# Altium footprint library myPCBLib.PcbLib: 113 footprints (part 3 of 8)
Each footprint in its own frame and in the unit in brackets; x right, y up, seen from the top. Pads: shape width x height; smd on the part's side, far side on the other; paste and mask are expansions set on the pad; w line width, h text height; cw(c..) or ccw(c..) is an arc to the next point about the centre after c.
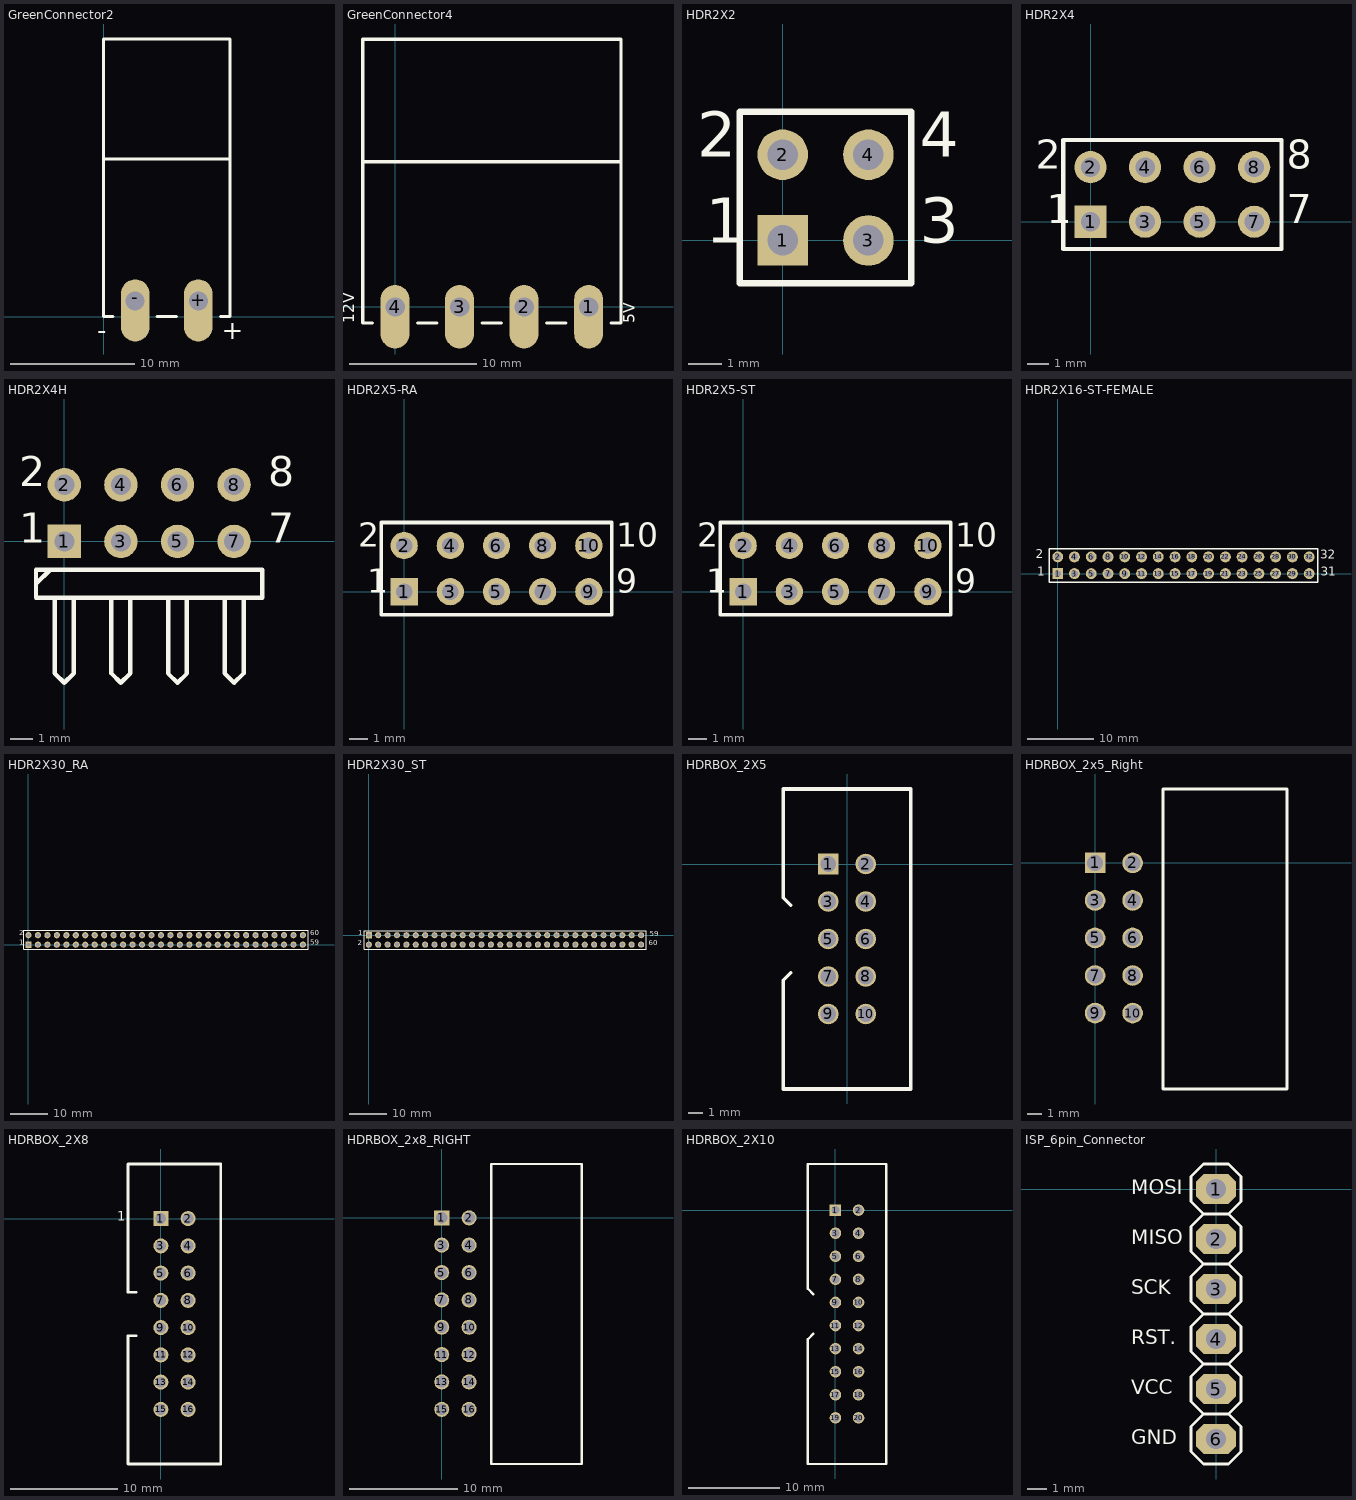
[diagram p2: the footprints below, top view; thin cyan lines are the x and y axes]

## GreenConnector2 [mil] "2 pin green connector"
height 314.96
pads (2):
  oval 90x196.85 hole 60 copper offset 0,-30: +(300,50) -(100,50)
Top Overlay:
  lines w10: 30,0 0,0 0,500 ; 170,0 230,0 ; 370,0 400,0 400,500 ; 0,500 0,880 400,880 400,500 ; 0,500 400,500
  text "-" at -19.68,-70.87 h60
  text "+" at 374.02,-70.87 h60

## GreenConnector4 [mil]
pads (4):
  oval 90x196.85 hole 60 copper offset 0,-30: 1(600,0) 2(400,0) 3(200,0) 4(0,0)
Top Overlay:
  lines w10: -70,-50 -100,-50 -100,450 ; 70,-50 130,-50 ; 270,-50 330,-50 ; 470,-50 530,-50 ; 670,-50 700,-50 700,450 ; -100,450 -100,830 700,830 700,450 ; -100,450 700,450
  text "5V" at 755,-50 h60
  text "12V" at -115,-50 h60

## HDR2X2 [mm]
pads (4):
  rect 1.5x1.5 hole 0.9: 1(0,0)
  round 1.5 hole 0.9: 2(0,2.54) 3(2.54,0) 4(2.54,2.54)
Top Overlay:
  lines w0.2: -1.27,-1.27 -1.27,3.81 3.81,3.81 3.81,-1.27 -1.27,-1.27
  text "1" at -2.286,-0.508 h2.29
  text "2" at -2.54,2.032 h2.29
  text "4" at 4.064,2.032 h2.29
  text "3" at 4.064,-0.508 h2.29

## HDR2X4 [mm]
pads (8):
  rect 1.5x1.5 hole 0.9: 1(0,0)
  round 1.5 hole 0.9: 2(0,2.54) 3(2.54,0) 4(2.54,2.54) 5(5.08,0) 6(5.08,2.54) 7(7.62,0) 8(7.62,2.54)
Top Overlay:
  lines w0.2: -1.27,-1.27 -1.27,3.81 8.89,3.81 8.89,-1.27 -1.27,-1.27
  text "8" at 9.144,2.032 h2.29
  text "7" at 9.144,-0.508 h2.29
  text "1" at -2.032,-0.508 h2.29
  text "2" at -2.54,2.032 h2.29
3D body: height 8.5, standoff -3, extent -1.27,-1.397 8.89,3.683

## HDR2X4H [mm]
pads (8):
  rect 1.5x1.5 hole 0.9: 1(0,0)
  round 1.5 hole 0.9: 2(0,2.54) 3(2.54,0) 4(2.54,2.54) 5(5.08,0) 6(5.08,2.54) 7(7.62,0) 8(7.62,2.54)
Top Overlay:
  lines w0.2: -1.27,-1.905 -0.635,-1.27 ; -0.423,-2.54 -0.423,-5.927 0,-6.35 0.423,-5.927 0.423,-2.54 ; 2.117,-2.54 2.117,-5.927 2.54,-6.35 2.963,-5.927 2.963,-2.54 ; 4.657,-2.54 4.657,-5.927 5.08,-6.35 5.503,-5.927 5.503,-2.54 ; 7.197,-2.54 7.197,-5.927 7.62,-6.35 8.043,-5.927 8.043,-2.54 ; -1.27,-2.54 -1.27,-1.27 8.89,-1.27 8.89,-2.54 -1.27,-2.54
  text "8" at 9.144,2.032 h2.29
  text "7" at 9.144,-0.508 h2.29
  text "1" at -2.032,-0.508 h2.29
  text "2" at -2.032,2.032 h2.29
3D body: height 5.04, standoff -2.96, extent -1.27,-9.996 8.89,2.884

## HDR2X5-RA [mm]
pads (10):
  rect 1.5x1.5 hole 0.9: 1(0,0)
  round 1.5 hole 0.9: 2(0,2.54) 3(2.54,0) 4(2.54,2.54) 5(5.08,0) 6(5.08,2.54) 7(7.62,0) 8(7.62,2.54) 9(10.16,0) 10(10.16,2.54)
Top Overlay:
  lines w0.2: -1.27,-1.27 11.43,-1.27 11.43,3.81 -1.27,3.81 -1.27,-1.27
  text "10" at 11.684,2.032 h2.29
  text "9" at 11.684,-0.508 h2.29
  text "1" at -2.032,-0.508 h2.29
  text "2" at -2.54,2.032 h2.29
3D body: height 5.04, standoff -2.96, extent -1.25,-10.055 11.45,2.825

## HDR2X5-ST [mm]
pads (10):
  rect 1.5x1.5 hole 0.9: 1(0,0)
  round 1.5 hole 0.9: 2(0,2.54) 3(2.54,0) 4(2.54,2.54) 5(5.08,0) 6(5.08,2.54) 7(7.62,0) 8(7.62,2.54) 9(10.16,0) 10(10.16,2.54)
Top Overlay:
  lines w0.2: -1.27,-1.27 -1.27,3.81 11.43,3.81 11.43,-1.27 -1.27,-1.27
  text "2" at -2.54,2.032 h2.29
  text "1" at -2.032,-0.508 h2.29
  text "9" at 11.684,-0.508 h2.29
  text "10" at 11.684,2.032 h2.29
3D body: height 8.5, standoff -3, extent -1.275,-1.175 11.425,3.905

## HDR2X16-ST-FEMALE [mil]
pads (32):
  rect 65x65 hole 40: 1(0,0)
  round 65 hole 40: 2(0,100) 3(100,0) 4(100,100) 5(200,0) 6(200,100) 7(300,0) 8(300,100) 9(400,0) 10(400,100) 11(500,0) 12(500,100) 13(600,0) 14(600,100) 15(700,0) 16(700,100) 17(800,0) 18(800,100) 19(900,0) 20(900,100) 21(1000,0) 22(1000,100) 23(1100,0) 24(1100,100) 25(1200,0) 26(1200,100) 27(1300,0) 28(1300,100) 29(1400,0) 30(1400,100) 31(1500,0) 32(1500,100)
Top Overlay:
  lines w7.87: -50,-50 -50,150 1550,150 1550,-50 -50,-50
  text "32" at 1566.26,70 h90
  text "31" at 1570,-30 h90
  text "1" at -121.42,-29.53 h90
  text "2" at -129.53,75.16 h90
3D body: height 334.65, standoff -125.98, extent -55,-50 1554.84,146.85

## HDR2X30_RA [mil]
pads (60):
  rect 65x65 hole 40: 1(0,0)
  round 65 hole 40: 2(0,100) 3(100,0) 4(100,100) 5(200,0) 6(200,100) 7(300,0) 8(300,100) 9(400,0) 10(400,100) 11(500,0) 12(500,100) 13(600,0) 14(600,100) 15(700,0) 16(700,100) 17(800,0) 18(800,100) 19(900,0) 20(900,100) 21(1000,0) 22(1000,100) 23(1100,0) 24(1100,100) 25(1200,0) 26(1200,100) 27(1300,0) 28(1300,100) 29(1400,0) 30(1400,100) 31(1500,0) 32(1500,100) 33(1600,0) 34(1600,100) 35(1700,0) 36(1700,100) 37(1800,0) 38(1800,100) 39(1900,0) 40(1900,100) 41(2000,0) 42(2000,100) 43(2100,0) 44(2100,100) 45(2200,0) 46(2200,100) 47(2300,0) 48(2300,100) 49(2400,0) 50(2400,100) 51(2500,0) 52(2500,100) 53(2600,0) 54(2600,100) 55(2700,0) 56(2700,100) 57(2800,0) 58(2800,100) 59(2900,0) 60(2900,100)
Top Overlay:
  lines w7.87: -50,-50 2955.12,-50 2955.12,150 -50,150 -50,-50
  text "60" at 2980,80 h90
  text "59" at 2980,-20 h90
  text "1" at -100,-20 h90
  text "2" at -100,80 h90
3D body: height 198.43, standoff -116.54, extent -48.23,-394.88 2951.77,112.21

## HDR2X30_ST [mil]
pads (60):
  rect 65x65 hole 40: 1(0,0)
  round 65 hole 40: 2(0,-100) 3(100,0) 4(100,-100) 5(200,0) 6(200,-100) 7(300,0) 8(300,-100) 9(400,0) 10(400,-100) 11(500,0) 12(500,-100) 13(600,0) 14(600,-100) 15(700,0) 16(700,-100) 17(800,0) 18(800,-100) 19(900,0) 20(900,-100) 21(1000,0) 22(1000,-100) 23(1100,0) 24(1100,-100) 25(1200,0) 26(1200,-100) 27(1300,0) 28(1300,-100) 29(1400,0) 30(1400,-100) 31(1500,0) 32(1500,-100) 33(1600,0) 34(1600,-100) 35(1700,0) 36(1700,-100) 37(1800,0) 38(1800,-100) 39(1900,0) 40(1900,-100) 41(2000,0) 42(2000,-100) 43(2100,0) 44(2100,-100) 45(2200,0) 46(2200,-100) 47(2300,0) 48(2300,-100) 49(2400,0) 50(2400,-100) 51(2500,0) 52(2500,-100) 53(2600,0) 54(2600,-100) 55(2700,0) 56(2700,-100) 57(2800,0) 58(2800,-100) 59(2900,0) 60(2900,-100)
Top Overlay:
  lines w7.87: -50,-150 2955.12,-150 2955.12,50 -50,50 -50,-150
  text "59" at 2990.16,-31.5 h90
  text "60" at 2982.28,-126.97 h90
  text "1" at -110.24,-20.67 h90
  text "2" at -115.16,-129.92 h90
3D body: height 334.65, standoff -118.11, extent -49.21,-151.57 2950.79,48.43

## HDRBOX_2X5 [mil] "Header Box 2x5"
pads (10):
  rect 55x55 hole 42: 1(-50,0)
  round 55 hole 42: 2(50,0) 3(-50,-100) 4(50,-100) 5(-50,-200) 6(50,-200) 7(-50,-300) 8(50,-300) 9(-50,-400) 10(50,-400)
Top Overlay:
  lines w10: -150,-290 -170,-310 -170,-600 170,-600 170,200 -170,200 -170,-90 -150,-110
3D body: height 346.46, standoff -118.11, extent -175.04,-595.28 195.04,200

## HDRBOX_2x5_Right [mil]
pads (10):
  rect 55x55 hole 42: 1(0,0)
  round 55 hole 42: 2(100,0) 3(0,-100) 4(100,-100) 5(0,-200) 6(100,-200) 7(0,-300) 8(100,-300) 9(0,-400) 10(100,-400)
Top Overlay:
  lines w8: 181.1,-602.36 181.1,0 181.1,196.85 314.96,196.85 511.81,196.85 511.81,-602.36 181.1,-602.36
  text "." at -3.94,59.06 h35

## HDRBOX_2X8 [mil] "Header Box 2x8"
pads (16):
  rect 55x55 hole 39.37: 1(0,0)
  round 55 hole 39.37: 2(100,0) 3(0,-100) 4(100,-100) 5(0,-200) 6(100,-200) 7(0,-300) 8(100,-300) 9(0,-400) 10(100,-400) 11(0,-500) 12(100,-500) 13(0,-600) 14(100,-600) 15(0,-700) 16(100,-700)
Top Overlay:
  lines w10: -90,-430 -120,-430 -120,-900 220,-900 220,200 -120,200 -120,-270 -90,-270
  text "1" at -160,-20 h60
3D body: height 346.46, standoff -118.11, extent -123.94,-897.64 246.14,197.63

## HDRBOX_2x8_RIGHT [mil]
pads (16):
  rect 55x55 hole 42: 1(0,0)
  round 55 hole 42: 2(100,0) 3(0,-100) 4(100,-100) 5(0,-200) 6(100,-200) 7(0,-300) 8(100,-300) 9(0,-400) 10(100,-400) 11(0,-500) 12(100,-500) 13(0,-600) 14(100,-600) 15(0,-700) 16(100,-700)
Top Overlay:
  lines w8: 181.1,-900 511.81,-900 511.81,196.85 181.1,196.85 181.1,0 181.1,-900
  text "." at -3.94,59.06 h35

## HDRBOX_2X10 [mil] "Header Box 2x10"
pads (20):
  rect 50x50 hole 35: 1(0,0)
  round 50 hole 35: 2(100,0) 3(0,-100) 4(100,-100) 5(0,-200) 6(100,-200) 7(0,-300) 8(100,-300) 9(0,-400) 10(100,-400) 11(0,-500) 12(100,-500) 13(0,-600) 14(100,-600) 15(0,-700) 16(100,-700) 17(0,-800) 18(100,-800) 19(0,-900) 20(100,-900)
Top Overlay:
  lines w10: -95,-535 -120,-560 -120,-1100 220,-1100 220,200 -120,200 -120,-340 -95,-365

## ISP_6pin_Connector [mil]
pads (6):
  oct 80x60 hole 40: 1(0,0) 2(0,-100) 3(0,-200) 4(0,-300) 5(0,-400) 6(0,-500)
Top Overlay:
  lines w6: -25,-450 25,-450 ; -25,-450 -50,-425 -50,-375 -25,-350 ; -25,-450 -50,-475 -50,-525 -25,-550 25,-550 50,-525 50,-475 25,-450 ; -25,-350 25,-350 ; -25,-350 -50,-325 -50,-275 -25,-250 ; -25,-250 25,-250 ; -25,-250 -50,-225 -50,-175 -25,-150 ; -25,-150 25,-150 ; -25,-150 -50,-125 -50,-75 -25,-50 ; -25,-50 25,-50 ; -25,-50 -50,-25 -50,25 -25,50 25,50 50,25 50,-25 25,-50 ; 25,-450 50,-425 50,-375 25,-350 ; 25,-350 50,-325 50,-275 25,-250 ; 25,-250 50,-225 50,-175 25,-150 ; 25,-150 50,-125 50,-75 25,-50
  text "GND" at -170,-520 h50
  text "VCC" at -170,-420 h50
  text "RST." at -170,-320 h50
  text "SCK" at -170,-220 h50
  text "MISO" at -170,-120 h50
  text "MOSI" at -170,-20 h50
3D body: height 99.02, standoff -118.11, extent -10,-550 388.82,50